# Altium footprint library WE-SHC.PcbLib: 139 footprints (part 8 of 10)
Each footprint in its own frame and in the unit in brackets; x right, y up, seen from the top. Pads: shape width x height; smd on the part's side, far side on the other; paste and mask are expansions set on the pad; w line width, h text height; cw(c..) or ccw(c..) is an arc to the next point about the centre after c.
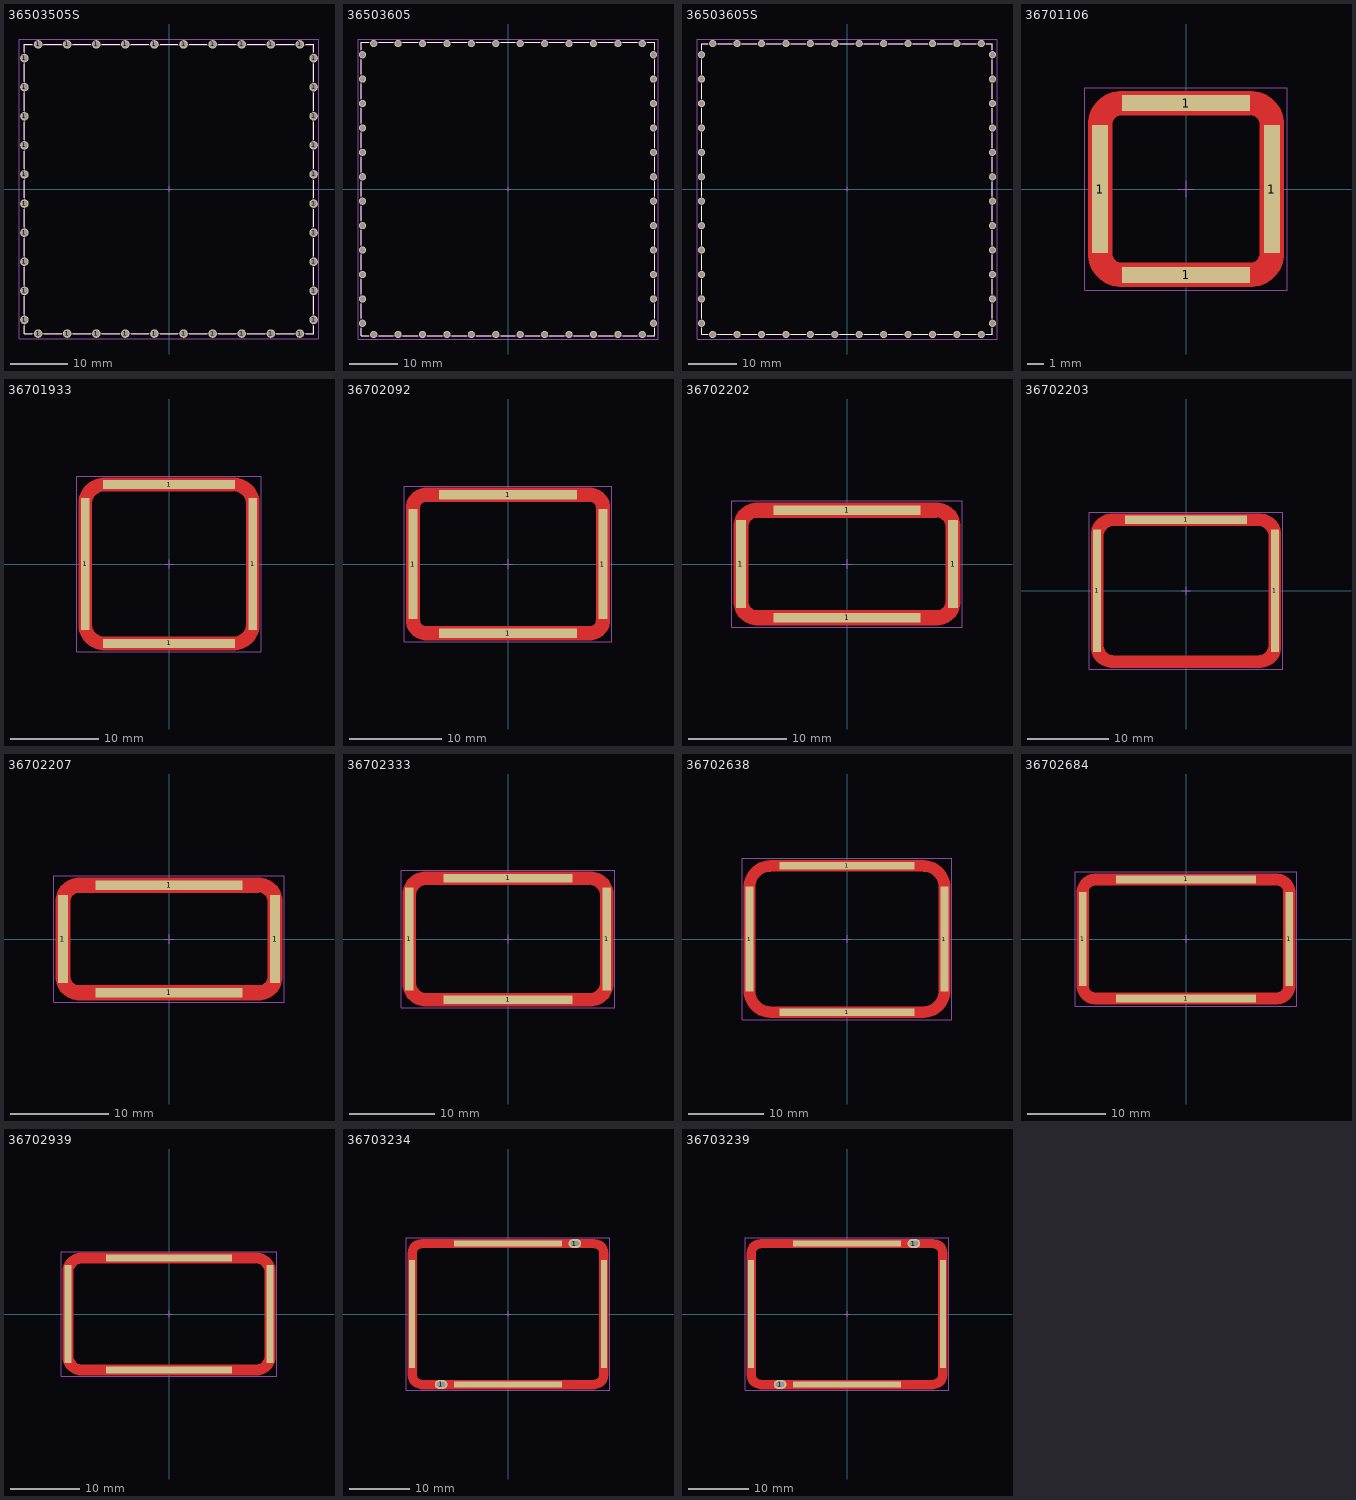
[diagram p7: the footprints below, top view; thin cyan lines are the x and y axes]

## 36503505S [mm] "Shielding Cabinet, THT Frame, body 50.4x50.4mm"
height 3.3
pads (40):
  round 1.5 hole 1.1: 1(-25.25,-22.86) 1(-25.25,-17.78) 1(-25.25,-12.7) 1(-25.25,-7.62) 1(-25.25,-2.54) 1(-25.25,2.54) 1(-25.25,7.62) 1(-25.25,12.7) 1(-25.25,17.78) 1(-25.25,22.86) 1(-22.86,-25.25) 1(-22.86,25.25) 1(-17.78,-25.25) 1(-17.78,25.25) 1(-12.7,-25.25) 1(-12.7,25.25) 1(-7.62,-25.25) 1(-7.62,25.25) 1(-2.54,-25.25) 1(-2.54,25.25) 1(2.54,-25.25) 1(2.54,25.25) 1(7.62,-25.25) 1(7.62,25.25) 1(12.7,-25.25) 1(12.7,25.25) 1(17.78,-25.25) 1(17.78,25.25) 1(22.86,-25.25) 1(22.86,25.25) 1(25.25,-22.86) 1(25.25,-17.78) 1(25.25,-12.7) 1(25.25,-7.62) 1(25.25,-2.54) 1(25.25,2.54) 1(25.25,7.62) 1(25.25,12.7) 1(25.25,17.78) 1(25.25,22.86)
Top Overlay:
  lines w0.2: -25.25,-23.85 -25.25,-25.25 -23.85,-25.25 ; -25.25,-21.87 -25.25,-18.75 ; -25.25,-16.81 -25.25,-13.69 ; -25.25,-11.73 -25.25,-8.61 ; -25.25,-6.65 -25.25,-3.53 ; -25.25,-1.57 -25.25,1.55 ; -25.25,3.51 -25.25,6.63 ; -25.25,8.59 -25.25,11.71 ; -25.25,13.67 -25.25,16.79 ; -25.25,18.75 -25.25,21.87 ; -25.25,23.85 -25.25,25.25 -23.85,25.25 ; -21.87,-25.25 -18.75,-25.25 ; -21.87,25.25 -18.75,25.25 ; -16.81,25.25 -13.69,25.25 ; -16.79,-25.25 -13.67,-25.25 ; -11.73,25.25 -8.61,25.25 ; -11.71,-25.25 -8.59,-25.25 ; -6.65,25.25 -3.53,25.25 ; -6.63,-25.25 -3.51,-25.25 ; -1.57,25.25 1.55,25.25 ; -1.55,-25.25 1.57,-25.25 ; 3.51,25.25 6.63,25.25 ; 3.53,-25.25 6.65,-25.25 ; 8.59,25.25 11.71,25.25 ; 8.61,-25.25 11.73,-25.25 ; 13.67,25.25 16.79,25.25 ; 13.69,-25.25 16.81,-25.25 ; 18.75,-25.25 21.87,-25.25 ; 18.75,25.25 21.87,25.25 ; 23.85,-25.25 25.25,-25.25 25.25,-23.85 ; 23.85,25.25 25.25,25.25 25.25,23.85 ; 25.25,-21.87 25.25,-18.75 ; 25.25,-16.79 25.25,-13.67 ; 25.25,-11.71 25.25,-8.59 ; 25.25,-6.63 25.25,-3.51 ; 25.25,-1.55 25.25,1.57 ; 25.25,3.53 25.25,6.65 ; 25.25,8.61 25.25,11.73 ; 25.25,13.69 25.25,16.81 ; 25.25,18.75 25.25,21.87
Top Designator:
  text ".Designator" at -7.498,-0.5 h1.5
Top Component Outline:
  lines w0.1: -25.2,-25.2 -25.2,25.2 25.2,25.2 25.2,-25.2 -25.2,-25.2
Top 3D Body:
  lines w0.1: -25.2,-25.2 25.2,-25.2 25.2,25.2 -25.2,25.2 -25.2,-25.2
Top Courtyard:
  lines w0.05: -0.5,0 0.5,0 ; 0,-0.5 0,0.5 ; -26.2,-26.2 -26.2,26.2 26.2,26.2 26.2,-26.2 -26.2,-26.2
3D body "36503505S.stp": height 3.23, standoff -2.87, extent -25.2,-25.2 25.2,25.2

## 36503605 [mm] "Shielding Cabinet, THT Frame, body 61x61mm"
height 3.6
pads (48):
  round 1.5 hole 1.1: 1(-30.25,-27.94) 1(-30.25,-22.86) 1(-30.25,-17.78) 1(-30.25,-12.7) 1(-30.25,-7.62) 1(-30.25,-2.54) 1(-30.25,2.54) 1(-30.25,7.62) 1(-30.25,12.7) 1(-30.25,17.78) 1(-30.25,22.86) 1(-30.25,27.94) 1(-27.94,-30.25) 1(-27.94,30.25) 1(-22.86,-30.25) 1(-22.86,30.25) 1(-17.78,-30.25) 1(-17.78,30.25) 1(-12.7,-30.25) 1(-12.7,30.25) 1(-7.62,-30.25) 1(-7.62,30.25) 1(-2.54,-30.25) 1(-2.54,30.25) 1(2.54,-30.25) 1(2.54,30.25) 1(7.62,-30.25) 1(7.62,30.25) 1(12.7,-30.25) 1(12.7,30.25) 1(17.78,-30.25) 1(17.78,30.25) 1(22.86,-30.25) 1(22.86,30.25) 1(27.94,-30.25) 1(27.94,30.25) 1(30.25,-27.94) 1(30.25,-22.86) 1(30.25,-17.78) 1(30.25,-12.7) 1(30.25,-7.62) 1(30.25,-2.54) 1(30.25,2.54) 1(30.25,7.62) 1(30.25,12.7) 1(30.25,17.78) 1(30.25,22.86) 1(30.25,27.94)
Top Overlay:
  lines w0.2: -30.55,-28.95 -30.55,-30.55 -28.95,-30.55 ; -30.55,-26.93 -30.55,-23.85 ; -30.55,-21.87 -30.55,-18.79 ; -30.55,-16.79 -30.55,-13.71 ; -30.55,-11.71 -30.55,-8.63 ; -30.55,-6.63 -30.55,-3.55 ; -30.55,-1.55 -30.55,1.53 ; -30.55,3.53 -30.55,6.61 ; -30.55,8.61 -30.55,11.69 ; -30.55,13.69 -30.55,16.77 ; -30.55,18.77 -30.55,21.85 ; -30.55,23.85 -30.55,26.93 ; -30.55,28.95 -30.55,30.55 -28.95,30.55 ; -26.93,-30.55 -23.85,-30.55 ; -26.93,30.55 -23.85,30.55 ; -21.87,30.55 -18.79,30.55 ; -21.85,-30.55 -18.77,-30.55 ; -16.79,30.55 -13.71,30.55 ; -16.77,-30.55 -13.69,-30.55 ; -11.71,30.55 -8.63,30.55 ; -11.69,-30.55 -8.61,-30.55 ; -6.63,30.55 -3.55,30.55 ; -6.61,-30.55 -3.53,-30.55 ; -1.55,30.55 1.53,30.55 ; -1.53,-30.55 1.55,-30.55 ; 3.53,30.55 6.61,30.55 ; 3.55,-30.55 6.63,-30.55 ; 8.61,30.55 11.69,30.55 ; 8.63,-30.55 11.71,-30.55 ; 13.69,30.55 16.77,30.55 ; 13.71,-30.55 16.79,-30.55 ; 18.77,30.55 21.85,30.55 ; 18.79,-30.55 21.87,-30.55 ; 23.85,-30.55 26.93,-30.55 ; 23.85,30.55 26.93,30.55 ; 28.95,-30.55 30.55,-30.55 30.55,-28.95 ; 28.95,30.55 30.55,30.55 30.55,28.95 ; 30.55,-26.93 30.55,-23.85 ; 30.55,-21.85 30.55,-18.77 ; 30.55,-16.77 30.55,-13.69 ; 30.55,-11.69 30.55,-8.61 ; 30.55,-6.61 30.55,-3.53 ; 30.55,-1.53 30.55,1.55 ; 30.55,3.55 30.55,6.63 ; 30.55,8.63 30.55,11.71 ; 30.55,13.71 30.55,16.79 ; 30.55,18.79 30.55,21.87 ; 30.55,23.85 30.55,26.93
Top Designator:
  text ".Designator" at -7.498,-0.5 h1.5
Top Component Outline:
  lines w0.1: -30.5,-30.5 30.5,-30.5 30.5,30.5 -30.5,30.5 -30.5,-30.5
Top 3D Body:
  lines w0.1: -30.5,-30.5 -30.5,30.5 30.5,30.5 30.5,-30.5 -30.5,-30.5
Top Courtyard:
  lines w0.05: -0.5,0 0.5,0 ; 0,-0.5 0,0.5 ; -31.2,-31.2 31.2,-31.2 31.2,31.2 -31.2,31.2 -31.2,-31.2
3D body "36503605.stp": height 3.5, standoff -2.9, extent -30.5,-30.5 30.5,30.5

## 36503605S [mm] "Shielding Cabinet, THT Frame, body 60.4x60.4mm"
height 3.3
pads (48):
  round 1.5 hole 1.1: 1(-30.25,-27.94) 1(-30.25,-22.86) 1(-30.25,-17.78) 1(-30.25,-12.7) 1(-30.25,-7.62) 1(-30.25,-2.54) 1(-30.25,2.54) 1(-30.25,7.62) 1(-30.25,12.7) 1(-30.25,17.78) 1(-30.25,22.86) 1(-30.25,27.94) 1(-27.94,-30.25) 1(-27.94,30.25) 1(-22.86,-30.25) 1(-22.86,30.25) 1(-17.78,-30.25) 1(-17.78,30.25) 1(-12.7,-30.25) 1(-12.7,30.25) 1(-7.62,-30.25) 1(-7.62,30.25) 1(-2.54,-30.25) 1(-2.54,30.25) 1(2.54,-30.25) 1(2.54,30.25) 1(7.62,-30.25) 1(7.62,30.25) 1(12.7,-30.25) 1(12.7,30.25) 1(17.78,-30.25) 1(17.78,30.25) 1(22.86,-30.25) 1(22.86,30.25) 1(27.94,-30.25) 1(27.94,30.25) 1(30.25,-27.94) 1(30.25,-22.86) 1(30.25,-17.78) 1(30.25,-12.7) 1(30.25,-7.62) 1(30.25,-2.54) 1(30.25,2.54) 1(30.25,7.62) 1(30.25,12.7) 1(30.25,17.78) 1(30.25,22.86) 1(30.25,27.94)
Top Overlay:
  lines w0.2: -30.25,-28.95 -30.25,-30.25 -28.95,-30.25 ; -30.25,-26.93 -30.25,-23.85 ; -30.25,-21.87 -30.25,-18.79 ; -30.25,-16.79 -30.25,-13.71 ; -30.25,-11.71 -30.25,-8.63 ; -30.25,-6.63 -30.25,-3.55 ; -30.25,-1.55 -30.25,1.53 ; -30.25,3.53 -30.25,6.61 ; -30.25,8.61 -30.25,11.69 ; -30.25,13.69 -30.25,16.77 ; -30.25,18.77 -30.25,21.85 ; -30.25,23.85 -30.25,26.93 ; -30.25,28.95 -30.25,30.25 -28.95,30.25 ; -26.93,-30.25 -23.85,-30.25 ; -26.93,30.25 -23.85,30.25 ; -21.87,30.25 -18.79,30.25 ; -21.85,-30.25 -18.77,-30.25 ; -16.79,30.25 -13.71,30.25 ; -16.77,-30.25 -13.69,-30.25 ; -11.71,30.25 -8.63,30.25 ; -11.69,-30.25 -8.61,-30.25 ; -6.63,30.25 -3.55,30.25 ; -6.61,-30.25 -3.53,-30.25 ; -1.55,30.25 1.53,30.25 ; -1.53,-30.25 1.55,-30.25 ; 3.53,30.25 6.61,30.25 ; 3.55,-30.25 6.63,-30.25 ; 8.61,30.25 11.69,30.25 ; 8.63,-30.25 11.71,-30.25 ; 13.69,30.25 16.77,30.25 ; 13.71,-30.25 16.79,-30.25 ; 18.77,30.25 21.85,30.25 ; 18.79,-30.25 21.87,-30.25 ; 23.85,-30.25 26.93,-30.25 ; 23.85,30.25 26.93,30.25 ; 28.95,-30.25 30.25,-30.25 30.25,-28.95 ; 28.95,30.25 30.25,30.25 30.25,28.95 ; 30.25,-26.93 30.25,-23.85 ; 30.25,-21.85 30.25,-18.77 ; 30.25,-16.77 30.25,-13.69 ; 30.25,-11.69 30.25,-8.61 ; 30.25,-6.61 30.25,-3.53 ; 30.25,-1.53 30.25,1.55 ; 30.25,3.55 30.25,6.63 ; 30.25,8.63 30.25,11.71 ; 30.25,13.71 30.25,16.79 ; 30.25,18.79 30.25,21.87 ; 30.25,23.85 30.25,26.93
Top Designator:
  text ".Designator" at -7.498,-0.5 h1.5
Top Component Outline:
  lines w0.1: -30.2,-30.2 -30.2,30.2 30.2,30.2 30.2,-30.2 -30.2,-30.2
Top 3D Body:
  lines w0.1: -30.2,-30.2 30.2,-30.2 30.2,30.2 -30.2,30.2 -30.2,-30.2
Top Courtyard:
  lines w0.05: -0.5,0 0.5,0 ; 0,-0.5 0,0.5 ; -31.2,-31.2 -31.2,31.2 31.2,31.2 31.2,-31.2 -31.2,-31.2
3D body "36503605S.stp": height 3.2, standoff -2.9, extent -30.2,-30.2 30.2,30.2

## 36701106 [mm] "Shielding Cabinet, SMT Frame Seamless, 11x11x6mm"
height 6
pads (4):
  rect 1x8 smd paste-2539.97 mask-2222: 1(-5.35,0) 1(5.35,0)
  rect 8x1 smd paste-2539.97 mask-2222: 1(0,-5.35) 1(0,5.35)
Top Layer:
  region: -6.1,-0.25 -6.1,-4 -6.1,-4.207 -6.019,-4.613 -5.861,-4.995 -5.631,-5.339 -5.339,-5.631 -4.995,-5.861 -4.613,-6.019 -4.207,-6.1 -4,-6.1 4,-6.1 4.207,-6.1 4.613,-6.019 4.995,-5.861 5.339,-5.631 5.631,-5.339 5.861,-4.995 6.019,-4.613 6.1,-4.207 6.1,-4 6.1,-0.25 4.6,-0.25 4.6,-4 4.588,-4.117 4.499,-4.333 4.333,-4.499 4.117,-4.588 4,-4.6 -4,-4.6 -4.117,-4.588 -4.333,-4.499 -4.499,-4.333 -4.588,-4.117 -4.6,-4 -4.6,-0.25
  region: -6.1,-1 -6.1,4 -6.1,4.207 -6.019,4.613 -5.861,4.995 -5.631,5.339 -5.339,5.631 -4.995,5.861 -4.613,6.019 -4.207,6.1 -4,6.1 4,6.1 4.207,6.1 4.613,6.019 4.995,5.861 5.339,5.631 5.631,5.339 5.861,4.995 6.019,4.613 6.1,4.207 6.1,4 6.1,-1 4.6,-1 4.6,4 4.588,4.117 4.499,4.333 4.333,4.499 4.117,4.588 4,4.6 -4,4.6 -4.117,4.588 -4.333,4.499 -4.499,4.333 -4.588,4.117 -4.6,4 -4.6,-1
Top Paste:
  region: -6.1,0.25 -6.1,4 -6.1,4.207 -6.019,4.613 -5.861,4.995 -5.631,5.339 -5.339,5.631 -4.995,5.861 -4.613,6.019 -4.207,6.1 -4,6.1 4,6.1 4.207,6.1 4.613,6.019 4.995,5.861 5.339,5.631 5.631,5.339 5.861,4.995 6.019,4.613 6.1,4.207 6.1,4 6.1,0.25 4.6,0.25 4.6,4 4.588,4.117 4.499,4.333 4.333,4.499 4.117,4.588 4,4.6 -4,4.6 -4.117,4.588 -4.333,4.499 -4.499,4.333 -4.588,4.117 -4.6,4 -4.6,0.25
  region: -6.1,-0.25 -6.1,-4 -6.1,-4.207 -6.019,-4.613 -5.861,-4.995 -5.631,-5.339 -5.339,-5.631 -4.995,-5.861 -4.613,-6.019 -4.207,-6.1 -4,-6.1 4,-6.1 4.207,-6.1 4.613,-6.019 4.995,-5.861 5.339,-5.631 5.631,-5.339 5.861,-4.995 6.019,-4.613 6.1,-4.207 6.1,-4 6.1,-0.25 4.6,-0.25 4.6,-4 4.588,-4.117 4.499,-4.333 4.333,-4.499 4.117,-4.588 4,-4.6 -4,-4.6 -4.117,-4.588 -4.333,-4.499 -4.499,-4.333 -4.588,-4.117 -4.6,-4 -4.6,-0.25
Notes:
  text "recommended tin paste thickness=0.5mm / customer to define the final stencil gap" at -6.3,-7.7 h0.4
Top Designator:
  text ".Designator" at -7.498,-0.5 h1.5
Top Component Outline:
  lines w0.1: -5.5,-4 ccw(c-4,-4) -4,-5.5 4,-5.5 ccw(c4,-4) 5.5,-4 5.5,4 ccw(c4,4) 4,5.5 -4,5.5 ccw(c-4,4) -5.5,4 -5.5,-4
Top 3D Body:
  lines w0.1: -5.5,-4 ccw(c-4,-4) -4,-5.5 4,-5.5 ccw(c4,-4) 5.5,-4 5.5,4 ccw(c4,4) 4,5.5 -4,5.5 ccw(c-4,4) -5.5,4 -5.5,-4
Top Courtyard:
  lines w0.05: -0.5,0 0.5,0 ; 0,-0.5 0,0.5 ; -6.3,-6.3 -6.3,6.3 6.3,6.3 6.3,-6.3 -6.3,-6.3
3D body "36701106.stp": height 6, standoff 0, extent -5.5,-5.5 5.5,5.5

## 36701933 [mm] "Shielding Cabinet, SMT Frame Seamless, 19.3x18.3x3.5mm"
height 3.5
pads (4):
  rect 1x15 smd paste-2539.97 mask-2222: 1(-9.5,0) 1(9.5,0)
  rect 15x1 smd paste-2539.97 mask-2222: 1(0,-9) 1(0,9)
Top Layer:
  region: -10.25,-1 -10.25,6.85 -10.25,7.04 -10.2,7.417 -10.102,7.784 -9.957,8.135 -9.766,8.465 -9.535,8.766 -9.266,9.035 -8.965,9.266 -8.635,9.457 -8.284,9.602 -7.917,9.7 -7.54,9.75 -7.35,9.75 7.35,9.75 7.54,9.75 7.917,9.7 8.284,9.602 8.635,9.457 8.965,9.266 9.266,9.035 9.535,8.766 9.766,8.465 9.957,8.135 10.102,7.784 10.2,7.417 10.25,7.04 10.25,6.85 10.25,-1 8.75,-1 8.75,6.8 8.743,6.942 8.688,7.221 8.579,7.484 8.421,7.72 8.22,7.921 7.984,8.079 7.721,8.188 7.442,8.243 7.3,8.25 -7.3,8.25 -7.442,8.243 -7.721,8.188 -7.984,8.079 -8.22,7.921 -8.421,7.72 -8.579,7.484 -8.688,7.221 -8.743,6.942 -8.75,6.8 -8.75,-1
  region: -10.25,-0.25 -10.25,-6.85 -10.25,-7.04 -10.2,-7.417 -10.102,-7.784 -9.957,-8.135 -9.766,-8.465 -9.535,-8.766 -9.266,-9.035 -8.965,-9.266 -8.635,-9.457 -8.284,-9.602 -7.917,-9.7 -7.54,-9.75 -7.35,-9.75 7.35,-9.75 7.54,-9.75 7.917,-9.7 8.284,-9.602 8.635,-9.457 8.965,-9.266 9.266,-9.035 9.535,-8.766 9.766,-8.465 9.957,-8.135 10.102,-7.784 10.2,-7.417 10.25,-7.04 10.25,-6.85 10.25,-0.25 8.75,-0.25 8.75,-6.8 8.743,-6.942 8.688,-7.221 8.579,-7.484 8.421,-7.72 8.22,-7.921 7.984,-8.079 7.721,-8.188 7.442,-8.243 7.3,-8.25 -7.3,-8.25 -7.442,-8.243 -7.721,-8.188 -7.984,-8.079 -8.22,-7.921 -8.421,-7.72 -8.579,-7.484 -8.688,-7.221 -8.743,-6.942 -8.75,-6.8 -8.75,-0.25
Top Paste:
  region: -10.25,-0.25 -10.25,-6.85 -10.25,-7.04 -10.2,-7.417 -10.102,-7.784 -9.957,-8.135 -9.766,-8.465 -9.535,-8.766 -9.266,-9.035 -8.965,-9.266 -8.635,-9.457 -8.284,-9.602 -7.917,-9.7 -7.54,-9.75 -7.35,-9.75 7.35,-9.75 7.54,-9.75 7.917,-9.7 8.284,-9.602 8.635,-9.457 8.965,-9.266 9.266,-9.035 9.535,-8.766 9.766,-8.465 9.957,-8.135 10.102,-7.784 10.2,-7.417 10.25,-7.04 10.25,-6.85 10.25,-0.25 8.75,-0.25 8.75,-6.8 8.743,-6.942 8.688,-7.221 8.579,-7.484 8.421,-7.72 8.22,-7.921 7.984,-8.079 7.721,-8.188 7.442,-8.243 7.3,-8.25 -7.3,-8.25 -7.442,-8.243 -7.721,-8.188 -7.984,-8.079 -8.22,-7.921 -8.421,-7.72 -8.579,-7.484 -8.688,-7.221 -8.743,-6.942 -8.75,-6.8 -8.75,-0.25
  region: -10.25,0.25 -10.25,6.85 -10.25,7.04 -10.2,7.417 -10.102,7.784 -9.957,8.135 -9.766,8.465 -9.535,8.766 -9.266,9.035 -8.965,9.266 -8.635,9.457 -8.284,9.602 -7.917,9.7 -7.54,9.75 -7.35,9.75 7.35,9.75 7.54,9.75 7.917,9.7 8.284,9.602 8.635,9.457 8.965,9.266 9.266,9.035 9.535,8.766 9.766,8.465 9.957,8.135 10.102,7.784 10.2,7.417 10.25,7.04 10.25,6.85 10.25,0.25 8.75,0.25 8.75,6.8 8.743,6.942 8.688,7.221 8.579,7.484 8.421,7.72 8.22,7.921 7.984,8.079 7.721,8.188 7.442,8.243 7.3,8.25 -7.3,8.25 -7.442,8.243 -7.721,8.188 -7.984,8.079 -8.22,7.921 -8.421,7.72 -8.579,7.484 -8.688,7.221 -8.743,6.942 -8.75,6.8 -8.75,0.25
Notes:
  text "recommended tin paste thickness=0.5mm / customer to define the final stencil gap" at -5.65,-11.3 h0.4
Top Designator:
  text ".Designator" at -7.498,-0.5 h1.5
Top Component Outline:
  lines w0.1: -9.65,-6.9 ccw(c-7.4,-6.9) -7.4,-9.15 7.4,-9.15 ccw(c7.4,-6.9) 9.65,-6.9 9.65,6.9 ccw(c7.4,6.9) 7.4,9.15 -7.4,9.15 ccw(c-7.4,6.9) -9.65,6.9 -9.65,-6.9
Top 3D Body:
  lines w0.1: -9.65,-6.9 ccw(c-7.4,-6.9) -7.4,-9.15 7.4,-9.15 ccw(c7.4,-6.9) 9.65,-6.9 9.65,6.9 ccw(c7.4,6.9) 7.4,9.15 -7.4,9.15 ccw(c-7.4,6.9) -9.65,6.9 -9.65,-6.9
Top Courtyard:
  lines w0.05: -0.5,0 0.5,0 ; 0,-0.5 0,0.5 ; -10.45,-9.95 -10.45,9.95 10.45,9.95 10.45,-9.95 -10.45,-9.95
3D body "36701933.stp": height 3.5, standoff 0, extent -9.65,-9.15 9.65,9.15

## 36702092 [mm] "Shielding Cabinet, SMT Frame Seamless, 20.9x15.3x2mm"
height 2
pads (4):
  rect 1x12 smd paste-2539.97 mask-2222: 1(-10.35,0) 1(10.35,0)
  rect 15x1 smd paste-2539.97 mask-2222: 1(0,-7.55) 1(0,7.55)
Top Layer:
  region: -11.1,-1 -11.1,6.15 -11.1,6.362 -11.017,6.777 -10.855,7.168 -10.62,7.521 -10.321,7.82 -9.968,8.055 -9.577,8.217 -9.162,8.3 -8.95,8.3 8.95,8.3 9.162,8.3 9.577,8.217 9.968,8.055 10.321,7.82 10.62,7.521 10.855,7.168 11.017,6.777 11.1,6.362 11.1,6.15 11.1,-1 9.6,-1 9.6,6.15 9.588,6.277 9.49,6.511 9.311,6.69 9.077,6.788 8.95,6.8 -8.95,6.8 -9.077,6.788 -9.311,6.69 -9.49,6.511 -9.588,6.277 -9.6,6.15 -9.6,-1
  region: -11.1,-0.25 -11.1,-6.15 -11.1,-6.362 -11.017,-6.777 -10.855,-7.168 -10.62,-7.521 -10.321,-7.82 -9.968,-8.055 -9.577,-8.217 -9.162,-8.3 -8.95,-8.3 8.95,-8.3 9.162,-8.3 9.577,-8.217 9.968,-8.055 10.321,-7.82 10.62,-7.521 10.855,-7.168 11.017,-6.777 11.1,-6.362 11.1,-6.15 11.1,-0.25 9.6,-0.25 9.6,-6.15 9.588,-6.277 9.49,-6.511 9.311,-6.69 9.077,-6.788 8.95,-6.8 -8.95,-6.8 -9.077,-6.788 -9.311,-6.69 -9.49,-6.511 -9.588,-6.277 -9.6,-6.15 -9.6,-0.25
Top Paste:
  region: -11.1,-0.25 -11.1,-6.15 -11.1,-6.362 -11.017,-6.777 -10.855,-7.168 -10.62,-7.521 -10.321,-7.82 -9.968,-8.055 -9.577,-8.217 -9.162,-8.3 -8.95,-8.3 8.95,-8.3 9.162,-8.3 9.577,-8.217 9.968,-8.055 10.321,-7.82 10.62,-7.521 10.855,-7.168 11.017,-6.777 11.1,-6.362 11.1,-6.15 11.1,-0.25 9.6,-0.25 9.6,-6.15 9.588,-6.277 9.49,-6.511 9.311,-6.69 9.077,-6.788 8.95,-6.8 -8.95,-6.8 -9.077,-6.788 -9.311,-6.69 -9.49,-6.511 -9.588,-6.277 -9.6,-6.15 -9.6,-0.25
  region: -11.1,0.25 -11.1,6.15 -11.1,6.362 -11.017,6.777 -10.855,7.168 -10.62,7.521 -10.321,7.82 -9.968,8.055 -9.577,8.217 -9.162,8.3 -8.95,8.3 8.95,8.3 9.162,8.3 9.577,8.217 9.968,8.055 10.321,7.82 10.62,7.521 10.855,7.168 11.017,6.777 11.1,6.362 11.1,6.15 11.1,0.25 9.6,0.25 9.6,6.15 9.588,6.277 9.49,6.511 9.311,6.69 9.077,6.788 8.95,6.8 -8.95,6.8 -9.077,6.788 -9.311,6.69 -9.49,6.511 -9.588,6.277 -9.6,6.15 -9.6,0.25
Notes:
  text "recommended tin paste thickness=0.5mm / customer to define the final stencil gap" at -5.6,-9.85 h0.4
Top Designator:
  text ".Designator" at -7.498,-0.5 h1.5
Top Component Outline:
  lines w0.1: -10.45,-6.15 ccw(c-8.95,-6.15) -8.95,-7.65 8.95,-7.65 ccw(c8.95,-6.15) 10.45,-6.15 10.45,6.15 ccw(c8.95,6.15) 8.95,7.65 -8.95,7.65 ccw(c-8.95,6.15) -10.45,6.15 -10.45,-6.15
Top 3D Body:
  lines w0.1: -10.45,-6.15 ccw(c-8.95,-6.15) -8.95,-7.65 8.95,-7.65 ccw(c8.95,-6.15) 10.45,-6.15 10.45,6.15 ccw(c8.95,6.15) 8.95,7.65 -8.95,7.65 ccw(c-8.95,6.15) -10.45,6.15 -10.45,-6.15
Top Courtyard:
  lines w0.05: -0.5,0 0.5,0 ; 0,-0.5 0,0.5 ; -11.3,-8.5 11.3,-8.5 11.3,8.5 -11.3,8.5 -11.3,-8.5
3D body "36702092.stp": height 2, standoff 0, extent -10.45,-7.65 10.45,7.65

## 36702202 [mm] "Shielding Cabinet, SMT Frame Seamless, 22x11.3x2.8mm"
height 2.8
pads (4):
  rect 1x9 smd paste-2539.97 mask-2222: 1(-10.85,0) 1(10.85,0)
  rect 15x1 smd paste-2539.97 mask-2222: 1(0,-5.5) 1(0,5.5)
Top Layer:
  region: -11.6,-0.25 -11.6,-3.85 -11.6,-4.086 -11.508,-4.55 -11.327,-4.987 -11.064,-5.38 -10.73,-5.714 -10.337,-5.977 -9.9,-6.158 -9.436,-6.25 -9.2,-6.25 9.2,-6.25 9.436,-6.25 9.9,-6.158 10.337,-5.977 10.73,-5.714 11.064,-5.38 11.327,-4.987 11.508,-4.55 11.6,-4.086 11.6,-3.85 11.6,-0.25 10.1,-0.25 10.1,-3.85 10.096,-3.938 10.061,-4.111 9.994,-4.274 9.896,-4.421 9.771,-4.546 9.624,-4.644 9.461,-4.711 9.288,-4.746 9.2,-4.75 -9.2,-4.75 -9.288,-4.746 -9.461,-4.711 -9.624,-4.644 -9.771,-4.546 -9.896,-4.421 -9.994,-4.274 -10.061,-4.111 -10.096,-3.938 -10.1,-3.85 -10.1,-0.25
  region: -11.6,-1 -11.6,3.85 -11.6,4.086 -11.508,4.55 -11.327,4.987 -11.064,5.38 -10.73,5.714 -10.337,5.977 -9.9,6.158 -9.436,6.25 -9.2,6.25 9.2,6.25 9.436,6.25 9.9,6.158 10.337,5.977 10.73,5.714 11.064,5.38 11.327,4.987 11.508,4.55 11.6,4.086 11.6,3.85 11.6,-1 10.1,-1 10.1,3.85 10.096,3.938 10.061,4.111 9.994,4.274 9.896,4.421 9.771,4.546 9.624,4.644 9.461,4.711 9.288,4.746 9.2,4.75 -9.2,4.75 -9.288,4.746 -9.461,4.711 -9.624,4.644 -9.771,4.546 -9.896,4.421 -9.994,4.274 -10.061,4.111 -10.096,3.938 -10.1,3.85 -10.1,-1
Top Paste:
  region: -11.6,0.25 -11.6,3.85 -11.6,4.086 -11.508,4.55 -11.327,4.987 -11.064,5.38 -10.73,5.714 -10.337,5.977 -9.9,6.158 -9.436,6.25 -9.2,6.25 9.2,6.25 9.436,6.25 9.9,6.158 10.337,5.977 10.73,5.714 11.064,5.38 11.327,4.987 11.508,4.55 11.6,4.086 11.6,3.85 11.6,0.25 10.1,0.25 10.1,3.85 10.096,3.938 10.061,4.111 9.994,4.274 9.896,4.421 9.771,4.546 9.624,4.644 9.461,4.711 9.288,4.746 9.2,4.75 -9.2,4.75 -9.288,4.746 -9.461,4.711 -9.624,4.644 -9.771,4.546 -9.896,4.421 -9.994,4.274 -10.061,4.111 -10.096,3.938 -10.1,3.85 -10.1,0.25
  region: -11.6,-0.25 -11.6,-3.85 -11.6,-4.086 -11.508,-4.55 -11.327,-4.987 -11.064,-5.38 -10.73,-5.714 -10.337,-5.977 -9.9,-6.158 -9.436,-6.25 -9.2,-6.25 9.2,-6.25 9.436,-6.25 9.9,-6.158 10.337,-5.977 10.73,-5.714 11.064,-5.38 11.327,-4.987 11.508,-4.55 11.6,-4.086 11.6,-3.85 11.6,-0.25 10.1,-0.25 10.1,-3.85 10.096,-3.938 10.061,-4.111 9.994,-4.274 9.896,-4.421 9.771,-4.546 9.624,-4.644 9.461,-4.711 9.288,-4.746 9.2,-4.75 -9.2,-4.75 -9.288,-4.746 -9.461,-4.711 -9.624,-4.644 -9.771,-4.546 -9.896,-4.421 -9.994,-4.274 -10.061,-4.111 -10.096,-3.938 -10.1,-3.85 -10.1,-0.25
Notes:
  text "recommended tin paste thickness=0.5mm / customer to define the final stencil gap" at -5.65,-7.9 h0.4
Top Designator:
  text ".Designator" at -7.498,-0.5 h1.5
Top Component Outline:
  lines w0.1: -11,-3.9 ccw(c-9.25,-3.9) -9.25,-5.65 9.25,-5.65 ccw(c9.25,-3.9) 11,-3.9 11,3.9 ccw(c9.25,3.9) 9.25,5.65 -9.25,5.65 ccw(c-9.25,3.9) -11,3.9 -11,-3.9
Top 3D Body:
  lines w0.1: -11,-3.9 ccw(c-9.25,-3.9) -9.25,-5.65 9.25,-5.65 ccw(c9.25,-3.9) 11,-3.9 11,3.9 ccw(c9.25,3.9) 9.25,5.65 -9.25,5.65 ccw(c-9.25,3.9) -11,3.9 -11,-3.9
Top Courtyard:
  lines w0.05: -0.5,0 0.5,0 ; 0,-0.5 0,0.5 ; -11.8,-6.45 -11.8,6.45 11.8,6.45 11.8,-6.45 -11.8,-6.45
3D body "36702202.stp": height 2.8, standoff 0, extent -11,-5.65 11,5.65
